# Altium footprint library pcb2D3D库101.PcbLib: 411 footprints (part 8 of 26)
Each footprint in its own frame and in the unit in brackets; x right, y up, seen from the top. Pads: shape width x height; smd on the part's side, far side on the other; paste and mask are expansions set on the pad; w line width, h text height; cw(c..) or ccw(c..) is an arc to the next point about the centre after c.
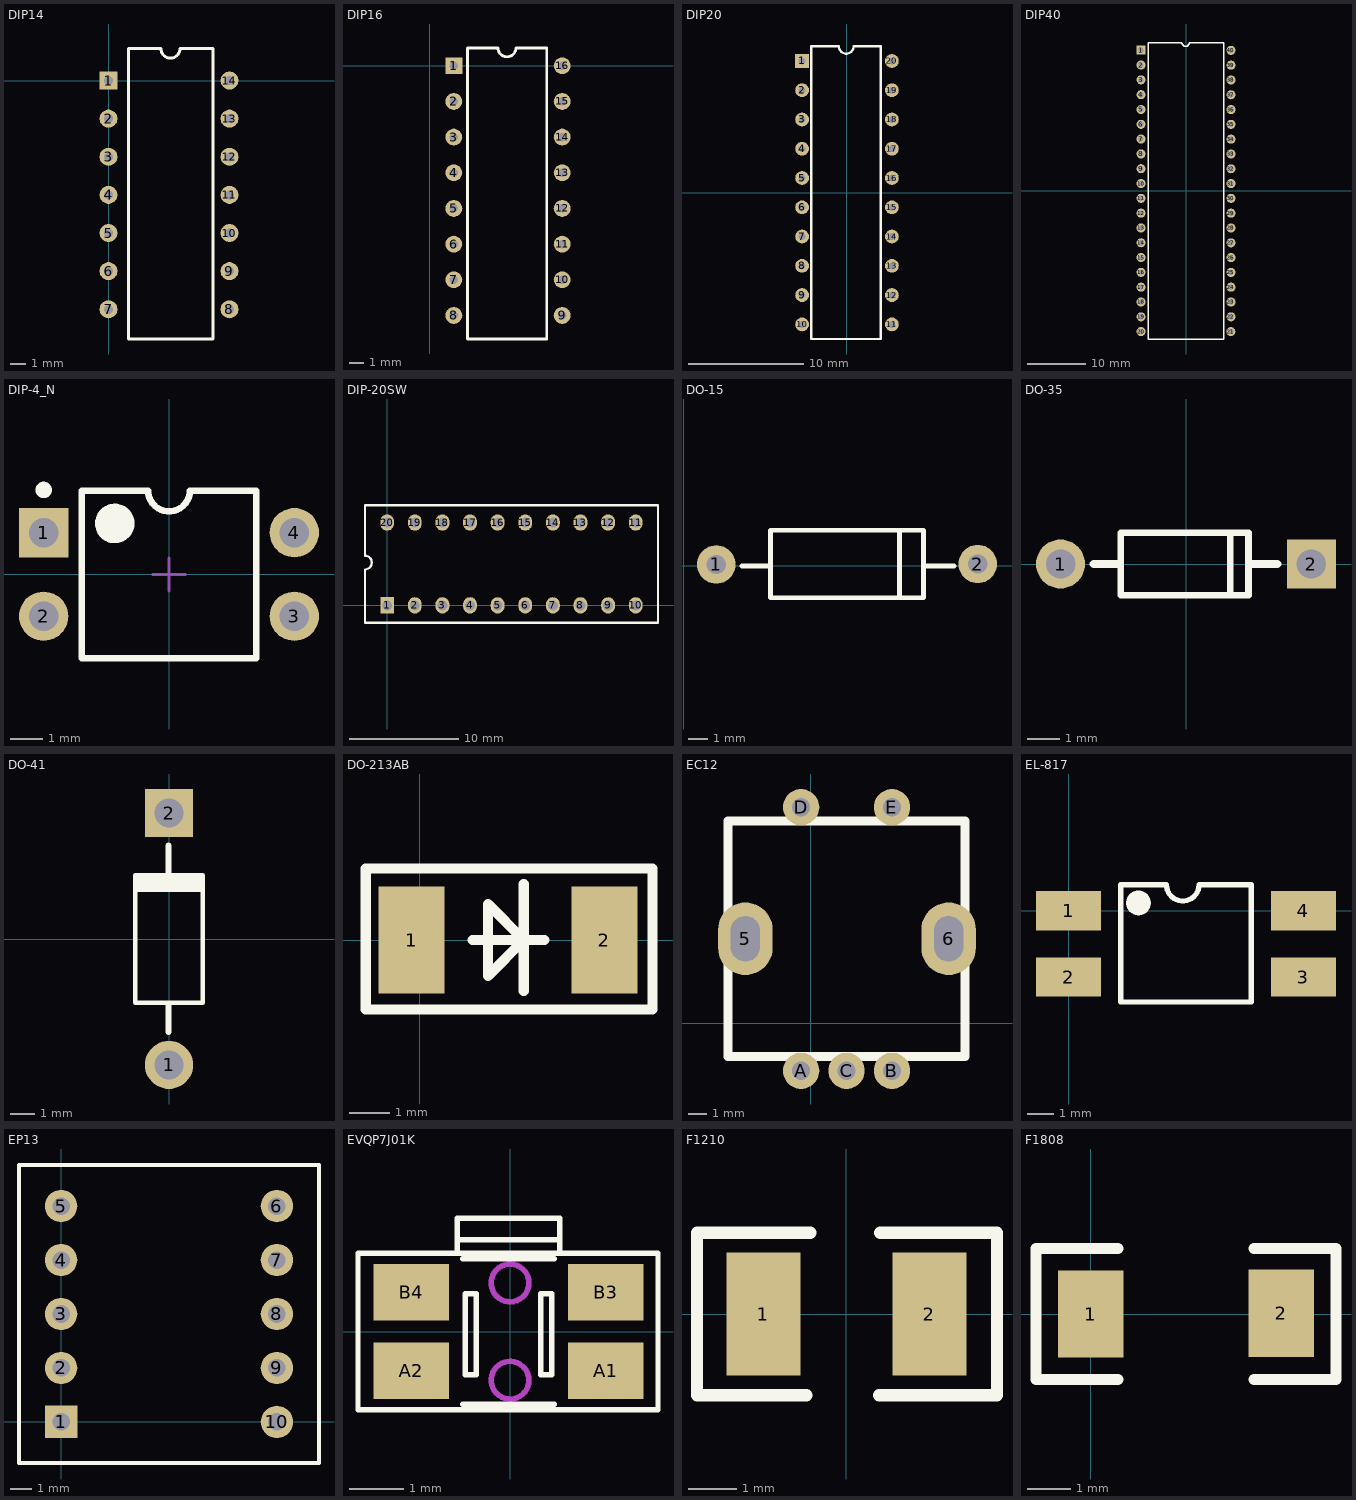
[diagram p7: the footprints below, top view; thin cyan lines are the x and y axes]

## DIP14 [mm]
pads (14):
  rect 1.2x1.2 hole 0.6: 1(0,0)
  round 1.2 hole 0.6: 2(0,-2.54) 3(0,-5.08) 4(0,-7.62) 5(0,-10.16) 6(0,-12.7) 7(0,-15.24) 8(8.062,-15.24) 9(8.062,-12.7) 10(8.062,-10.16) 11(8.062,-7.62) 12(8.062,-5.08) 13(8.062,-2.54) 14(8.062,0)
TopOverlay:
  lines w0.2: 1.321,-17.221 6.96,-17.221 6.96,2.134 4.763,2.134 cw(c4.128,2.134) 3.493,2.134 1.321,2.134 1.321,-17.221
3D body "DIP14.step": height 4.19, standoff -2.67, extent 0.102,-17.12 7.976,1.93

## DIP16 [mm]
pads (16):
  rect 1.2x1.2 hole 0.6: 1(1.719,0)
  round 1.2 hole 0.6: 2(1.719,-2.54) 3(1.719,-5.08) 4(1.719,-7.62) 5(1.719,-10.16) 6(1.719,-12.7) 7(1.719,-15.24) 8(1.719,-17.78) 9(9.433,-17.78) 10(9.433,-15.24) 11(9.433,-12.7) 12(9.433,-10.16) 13(9.433,-7.62) 14(9.433,-5.08) 15(9.433,-2.54) 16(9.433,0)
TopOverlay:
  lines w0.2: 2.692,-19.456 8.331,-19.456 8.331,1.27 6.135,1.27 cw(c5.5,1.27) 4.865,1.27 2.692,1.27 2.692,-19.456
3D body "User Library-DIP16-300.step": height 5.08, standoff -2.49, extent 1.554,-18.628 9.424,1.371

## DIP20 [mm]
pads (20):
  rect 1.2x1.2 hole 0.6: 1(-3.895,11.43)
  round 1.2 hole 0.6: 2(-3.895,8.89) 3(-3.895,6.35) 4(-3.895,3.81) 5(-3.895,1.27) 6(-3.895,-1.27) 7(-3.895,-3.81) 8(-3.895,-6.35) 9(-3.895,-8.89) 10(-3.895,-11.43) 11(3.895,-11.43) 12(3.895,-8.89) 13(3.895,-6.35) 14(3.895,-3.81) 15(3.895,-1.27) 16(3.895,1.27) 17(3.895,3.81) 18(3.895,6.35) 19(3.895,8.89) 20(3.895,11.43)
TopOverlay:
  lines w0.2: -3.1,-12.7 -3.1,12.7 -0.699,12.7 ccw(c-0.064,12.7) 0.572,12.7 2.92,12.7 2.92,-12.7 -3.1,-12.7
3D body "DIP-20-300.STEP": height 4.5, standoff -3.5, extent -3.907,-12.622 3.854,12.978

## DIP40 [mil]
pads (40):
  rect 61x61 hole 35: 1(-303.88,950.19)
  round 61 hole 35: 2(-303.62,850.17) 3(-303.62,750.15) 4(-303.62,650.13) 5(-303.62,550.11) 6(-303.62,450.09) 7(-303.62,350.07) 8(-303.62,250.05) 9(-303.62,150.03) 10(-303.62,50.01) 11(-303.62,-50.01) 12(-303.62,-150.03) 13(-303.62,-250.05) 14(-303.62,-350.07) 15(-303.62,-450.09) 16(-303.62,-550.11) 17(-303.62,-650.13) 18(-303.62,-750.15) 19(-303.62,-850.17) 20(-303.62,-950.19) 21(303.04,-950.19) 22(303.88,-850.21) 23(303.88,-750.23) 24(303.88,-650.25) 25(303.88,-550.28) 26(303.88,-450.3) 27(303.88,-350.32) 28(303.88,-250.34) 29(303.88,-150.36) 30(303.88,-50.39) 31(303.88,49.59) 32(303.88,149.57) 33(303.88,249.55) 34(303.88,349.53) 35(303.88,449.5) 36(303.88,549.48) 37(303.88,649.46) 38(303.88,749.44) 39(303.88,849.42) 40(303.88,949.39)
TopOverlay:
  lines w10: -254.04,-1000.19 253.88,-1000.19 253.88,1001.06 21.79,1001.06 cw(c-3.21,1001.06) -28.21,1001.06 -254.04,1001.06 -254.04,-1000.19
3D body "DIP40.step": height 224.41, standoff -101.57, extent -303.72,-1026.29 306.12,1038.67

## DIP-4_N [mm] "光耦（未加焊）"
height 5.6
pads (4):
  rect 1.5x1.5 hole 0.9: 1(-3.81,1.27)
  round 1.5 hole 0.9: 2(-3.81,-1.27) 3(3.81,-1.27) 4(3.81,1.27)
TopOverlay:
  circle w0.6: c-1.65,1.55 r0.3
  circle w0.25: c-3.81,2.57 r0.125
  lines w0.2: -2.65,-2.55 2.65,-2.55 2.65,2.55 0.635,2.55 cw(c0,2.55) -0.635,2.55 -2.65,2.55 -2.65,-2.55
Mechanical15:
  lines w0.1: -0.5,0 0.5,0 ; 0,-0.5 0,0.5
3D body "DIP-4_N.stp": height 4.78, standoff -3, extent -3.915,-2.25 3.925,2.27

## DIP-20SW [mm] "DIP; 16 Leads; Row Spacing 7.62 mm; Pitch 2.54 mm"
pads (20):
  rect 1.27x1.5 hole 0.9: 1(0,0)
  oval 1.27x1.5 hole 0.9: 2(2.54,0) 3(5.08,0) 4(7.62,0) 5(10.16,0) 6(12.7,0) 7(15.24,0) 8(17.78,0) 9(20.32,0) 10(22.86,0) 11(22.86,7.62) 12(20.32,7.62) 13(17.78,7.62) 14(15.24,7.62) 15(12.7,7.62) 16(10.16,7.62) 17(7.62,7.62) 18(5.08,7.62) 19(2.54,7.62) 20(0,7.62)
TopOverlay:
  lines w0.2: -2.05,-1.59 -2.05,3.3 ccw(c-2.05,3.935) -2.05,4.57 ; -2.05,4.6 -2.05,9.2 ; 24.91,-1.59 24.91,9.2
  lines w0.203: -2.05,-1.59 24.892,-1.59 ; -2.05,9.2 24.892,9.2
3D body "User Library-DIP Switch Piano 10X.STEP": height 8.71, standoff -3.99, extent -2.086,-2.639 24.794,8.661

## DO-15 [mm] "DO-15"
pads (2):
  round 2 hole 1: 1(1.676,0.076) 2(15.265,0.102)
TopOverlay:
  lines w0.254: 3.023,0 4.445,0 ; 11.201,-1.651 11.201,1.854 ; 11.709,-1.651 11.735,-1.651 ; 12.522,0 14.046,0 ; 4.496,-1.651 4.496,1.854 12.446,1.854 12.446,-1.651 4.496,-1.651
3D body "DO-15.step": height 4.78, standoff -1, extent 1.245,-1.676 15.705,1.889

## DO-35 [mm] "DO-204AH"
pads (2):
  round 1.5 hole 0.9: 1(-3.835,0)
  rect 1.5x1.5 hole 0.9: 2(3.835,0)
TopOverlay:
  lines w0.2: 1.352,-0.95 1.352,0.95 ; 1.899,-0.95 -2.001,-0.95 -2.001,0.95 1.899,0.95 ; 1.911,-0.95 1.911,0.95
  lines w0.254: -2.819,0 -2.026,0 ; 1.956,0 2.794,0
3D body "1N4007.STEP": height 3.33, standoff -1, extent -4.216,-1.321 4.191,1.346

## DO-41 [mm]
pads (2):
  round 2 hole 1.2: 1(0,-5.23)
  rect 2x2 hole 1.2: 2(0,5.23)
TopOverlay:
  region: 1.4,1.95 1.4,2.75 -1.4,2.75 -1.4,1.95
  lines w0.2: -1.4,2.65 -1.4,-2.65 1.4,-2.65 1.4,2.65
  lines w0.254: -0.025,-3.858 -0.025,-2.69 ; -0.025,2.466 -0.025,3.889
3D body "DO-41.STEP": height 3.3, standoff -2, extent -1.279,-5.599 1.321,5.461

## DO-213AB [mil] "LL4150X25MM"
pads (2):
  rect 65x105 smd: 1(-8,0) 2(181,0)
TopOverlay:
  lines w10: 52,0 122,0 ; 102,-50 102,55 ; -53,-68 228,-68 228,70 -53,70 -53,-68 ; 67,-35 102,0 67,35 67,-35
3D body "DO-213AB.step": height 52.56, standoff -52.56, extent -17.36,-52.12 187.36,53

## EC12 [mm] "编码器"
pads (7):
  oval 3x4 hole 1.6 slot 2.5 at 90 deg: 5(-3.607,4.648) 6(7.569,4.648)
  round 2 hole 1: A(-0.544,-2.616) B(4.456,-2.616) C(1.956,-2.616) D(-0.544,11.884) E(4.456,11.884)
TopOverlay:
  lines w0.508: -4.561,-1.829 -4.561,11.125 8.469,11.125 8.469,-1.829 -4.561,-1.829
3D body "EC12E-bushing-20.STEP": height 20.05, standoff -3.5, extent -5.014,-2.87 8.977,11.379

## EL-817 [mm]
pads (4):
  rect 2.5x1.5 smd: 1(0,0) 2(0,-2.54) 3(9,-2.54) 4(9,0)
TopOverlay:
  circle w0.5: c2.676,0.3 r0.224
  lines w0.2: 3.7,1 2,1 2,-3.5 7,-3.5 7,1 5,1 cw(c4.375,1) 3.75,1
3D body "User Library-4-SMD.STEP": height 3.75, standoff -0.01, extent -0.52,-3.569 9.64,1.029

## EP13 [mm]
height 0.272
pads (10):
  rect 1.5x1.5 hole 0.813: 1(0,0)
  round 1.5 hole 0.813: 2(0,2.5) 3(0,5) 4(0,7.5) 5(0,10) 6(10,10) 7(10,7.5) 8(10,5) 9(10,2.5) 10(10,0)
TopOverlay:
  lines w0.2: -1.95,-1.9 -1.95,11.9 11.95,11.9 11.95,-1.9 -1.95,-1.9
3D body "EP13.step": height 12.4, standoff -4, extent -1.501,-1.502 11.501,11.5

## EVQP7J01K [mm] "PUSH BUTTON SWITCH"
pads (4):
  rect 1.4x1.05 smd: A1(1.772,-0.722) A2(-1.828,-0.722) B3(1.772,0.728) B4(-1.828,0.728)
TopOverlay:
  lines w0.1: -0.978,1.703 0.922,1.703 ; -0.878,-1.347 0.822,-1.347 ; -0.878,1.353 0.822,1.353 ; -0.978,1.453 0.922,1.453 ; -0.978,1.453 -2.819,1.453 -2.819,-1.447 2.743,-1.447 2.743,1.453 0.922,1.453 ; -0.978,1.453 -0.978,2.103 0.922,2.103 0.922,1.703 ; 0.922,1.453 0.922,1.703 ; -0.828,-0.797 -0.828,0.703 -0.628,0.703 -0.628,-0.797 -0.828,-0.797 ; 0.572,-0.797 0.572,0.703 0.772,0.703 0.772,-0.797 0.572,-0.797
KeepOutLayer:
  circle w0.1: c0,-0.9 r0.35
  circle w0.1: c0,0.91 r0.35
Mechanical1:
  circle w0.1: c0,-0.9 r0.35
  circle w0.1: c0,0.9 r0.35
3D body "User Library-EVQP7-JA-01P.STEP": height 1.35, standoff 0, extent -2.35,-1.46 2.35,2.09

## F1210 [mil]
pads (2):
  rect 60x100 smd: 1(-67.5,0) 2(67.5,0)
TopOverlay:
  lines w10: -32.5,-66 -121.5,-66 -121.5,66 -29.5,66 ; 26.5,-66 122.5,-66 122.5,66 ; 27.5,66 121.3,66
3D body "User Library-Fuse1210.step": height 26.57, standoff 0, extent -63.78,-50.68 62.79,50.69

## F1808 [mil]
pads (2):
  rect 60x80 smd: 1(0,0) 2(174.88,0.76)
TopOverlay:
  lines w10: 25,-60 -50,-60 -50,60 25,60 ; 150,-60 225,-60 225,60 150,60
3D body "R1808(4520M)1.STEP": height 39.37, standoff 0, extent -2.88,-37.48 174.88,39